# Altium footprint library usb.PcbLib: 20 footprints (part 2 of 2)
Each footprint in its own frame and in the unit in brackets; x right, y up, seen from the top. Pads: shape width x height; smd on the part's side, far side on the other; paste and mask are expansions set on the pad; w line width, h text height; cw(c..) or ccw(c..) is an arc to the next point about the centre after c.
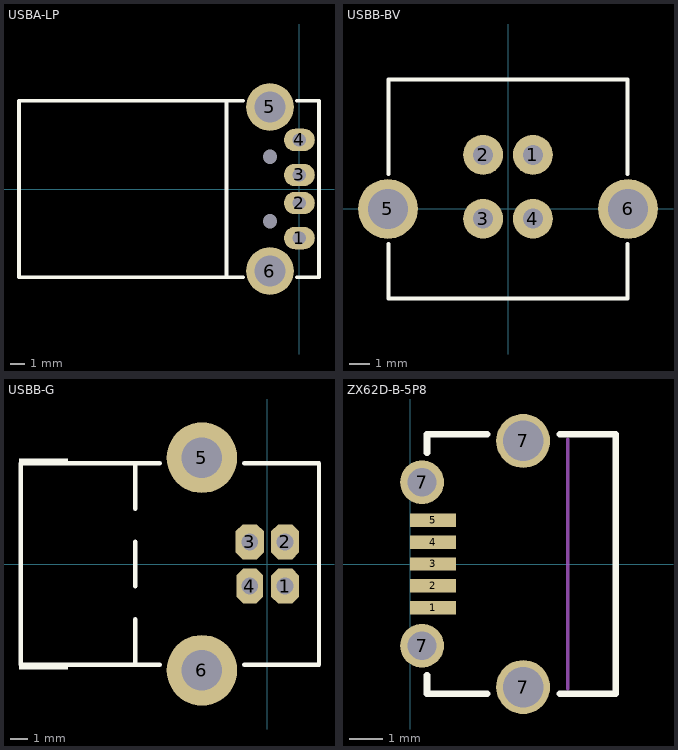
[diagram p1: the footprints below, top view; thin cyan lines are the x and y axes]

## USBA-LP [mm] "USB-A PCB Angle Socket"
height 4.5
pads (8):
  round 0 hole 1: 0(-2.1,-2.3) 0(-2.1,2.3)
  oval 2.2x1.6 hole 0.95: 1(0,-3.5) 2(0,-1) 3(0,1) 4(0,3.5)
  round 3.4 hole 2.2: 5(-2.1,5.85) 6(-2.1,-5.85)
Top Overlay:
  lines w0.254: -5.2,-6.3 -5.2,6.3 ; -4,-6.3 -20,-6.3 -20,6.3 -4,6.3 ; -0.2,-6.3 1.4,-6.3 1.4,6.3 -0.2,6.3
3D body "Samtec3dPS-USB-AM.STEP": height 1.18, standoff -4.52, extent -19.751,-6.25 0.279,6.25

## USBB-BV [mm] "Connfly USB-B Vertical Connector (DS1099-01-WN0)"
pads (6):
  round 2 hole 1: 1(1.25,2.71) 2(-1.25,2.71) 3(-1.25,-0.49) 4(1.25,-0.49)
  round 3 hole 2: 5(-6.02,0) 6(6.02,0)
Top Overlay:
  lines w0.2: -6,-1.75 -6,-4.5 6,-4.5 6,-1.75 ; -6,1.75 -6,6.5 6,6.5 6,1.75
3D body "Samtec-USB-B-S-F-W-VT.step": height 16, standoff -5.15, extent -7.519,-4.5 7.519,6.5

## USBB-G [mm] "USB-B PCB Angle Socket"
height 10.6
pads (6):
  oct 1.6x2 hole 0.95: 1(1,-1.25) 2(1,1.25) 3(-1,1.25)
  oct 1.5x2 hole 0.95: 4(-1,-1.25)
  round 4 hole 2.3: 5(-3.71,6.02) 6(-3.71,-6.02)
Top Overlay:
  region: -11.303,-5.715 -14.072,-5.715 -14.072,-5.969 -11.303,-5.969
  rectangle: -14.072,5.715 -11.303,5.969
  lines w0.254: -7.5,-5.639 -7.5,-3.119 ; -7.5,-1.25 -7.5,1.25 ; -7.5,3.119 -7.5,5.639 ; -6.1,-5.715 -13.97,-5.715 -13.97,5.715 -6.1,5.715 ; -1.3,-5.715 2.921,-5.715 2.921,5.715 -1.3,5.715
3D body "SW3dPS-67068-0000-molex.STEP": height 11, standoff -4.42, extent -14.003,-7.467 2.997,7.416

## ZX62D-B-5P8 [mm] "Hirose USB Micro B Receptable (PartNo: ZX62D-B-5P8)"
height 2.7
pads (9):
  rect 1.35x0.4 smd: 1(0.675,-1.3) 2(0.675,-0.65) 3(0.675,0) 4(0.675,0.65) 5(0.675,1.3)
  round 1.3 hole 0.85: 7(0.35,-2.425) 7(0.35,2.425)
  round 1.6 hole 1.2: 7(3.35,-3.65) 7(3.35,3.65)
Top Overlay:
  lines w0.2: 0.5,-3.302 0.5,-3.85 2.286,-3.85 ; 0.5,3.302 0.5,3.85 2.286,3.85 ; 4.445,-3.85 6.1,-3.85 6.1,3.85 4.445,3.85
Mechanical 1:
  lines w0.1: 4.675,-3.7 4.675,3.7
  text "PCB Edge" at 4.5,-3.525 h0.8
3D body "ZX62D-B-5P8.stp": height 2.75, standoff -0.75, extent 0.3,-4.043 6.1,4.05